# Altium footprint library 总库.PcbLib: 264 footprints (part 16 of 17)
Each footprint in its own frame and in the unit in brackets; x right, y up, seen from the top. Pads: shape width x height; smd on the part's side, far side on the other; paste and mask are expansions set on the pad; w line width, h text height; cw(c..) or ccw(c..) is an arc to the next point about the centre after c.
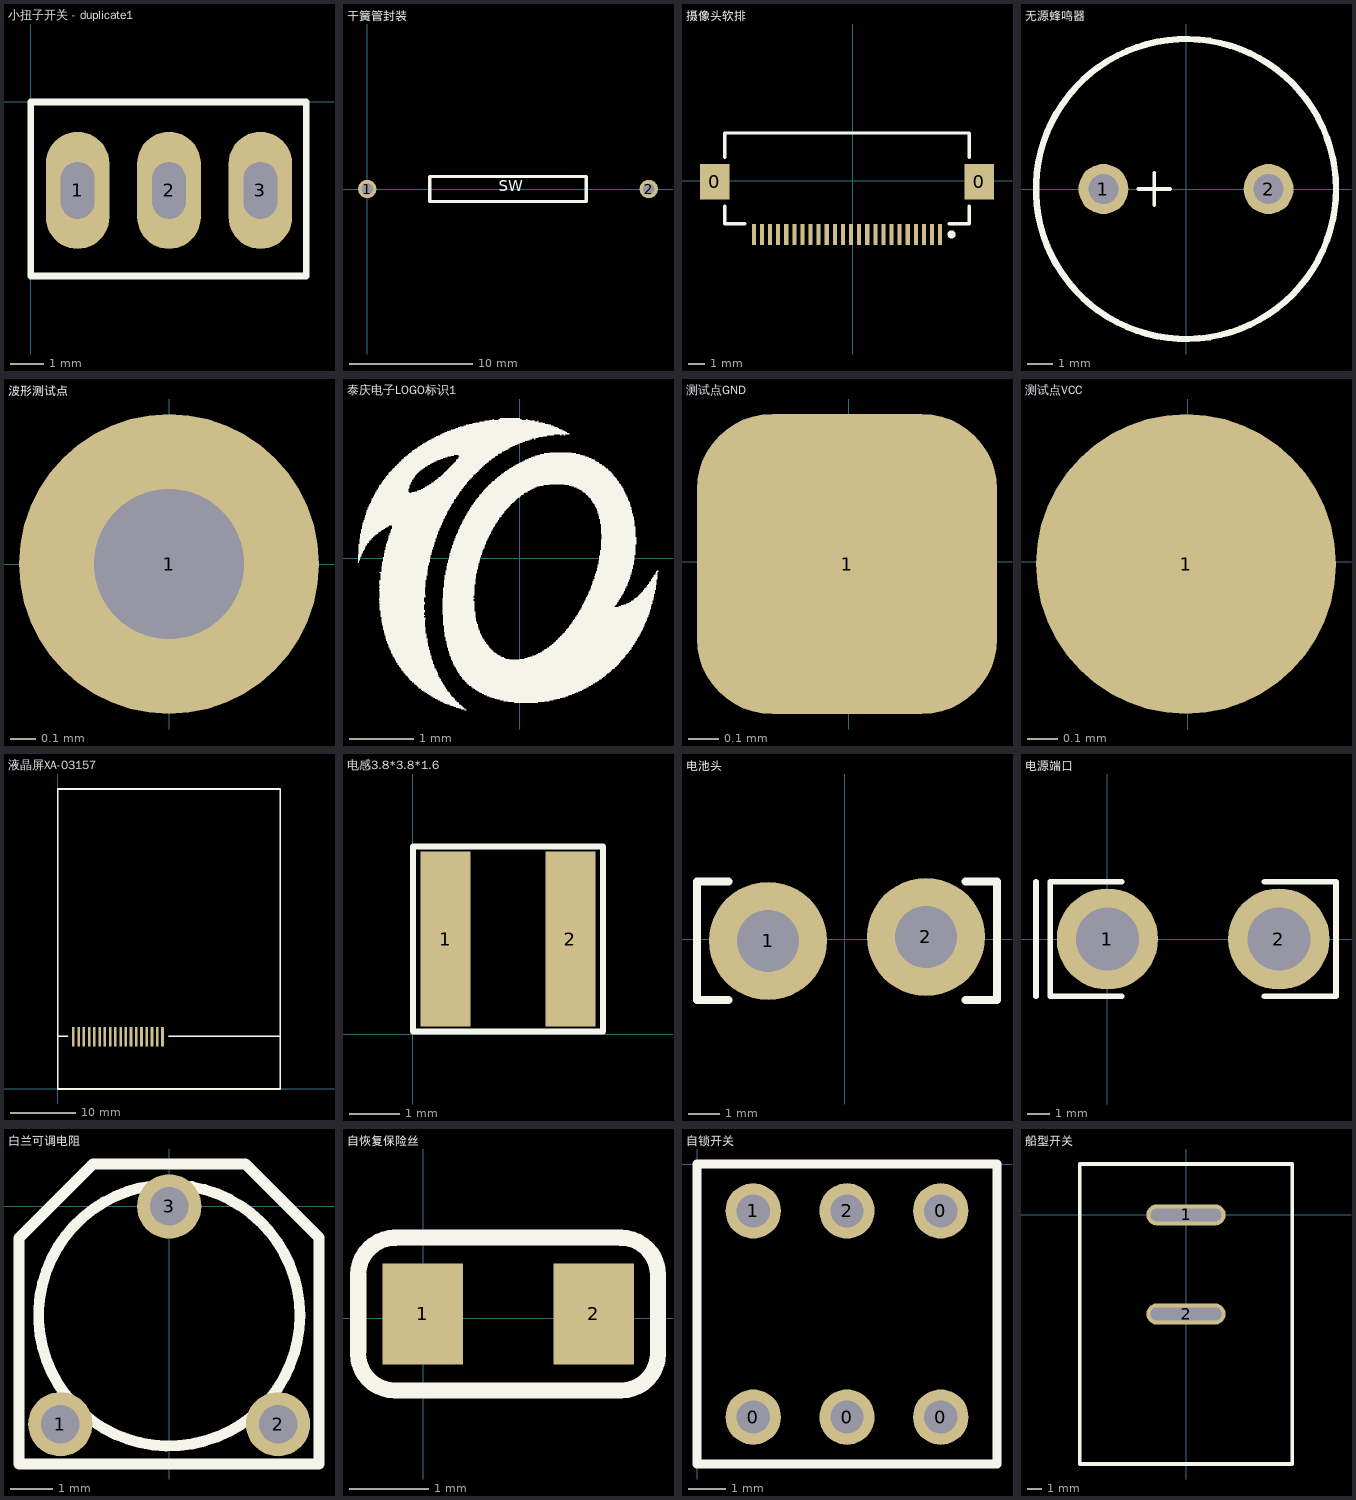
[diagram p15: the footprints below, top view; thin cyan lines are the x and y axes]

## 小扭子开关 - duplicate1 [mm]
pads (3):
  oval 1.9x3.5 hole 1 slot 1.7 at 90 deg: 1(1.397,-2.642) 2(4.127,-2.642) 3(6.858,-2.642)
Top Overlay:
  lines w0.203: 8.2,-5.2 0,-5.2 0,0 8.2,0 ; 8.23,-5.2 8.23,0

## 干簧管封装 [mm]
pads (2):
  round 1.5 hole 0.9: 1(0,0) 2(22.86,0)
Top Overlay:
  lines w0.254: 5.08,-1.016 17.78,-1.016 17.78,1.016 5.08,1.016 5.08,-1.016
  text "SW" at 10.668,-0.508 h1.52

## 摄像头软排 [mm]
pads (26):
  rect 1.8x2.2 smd: 0(-8.514,-0.051) 0(7.802,-0.051)
  rect 0.25x1.3 smd: 1(5.394,-3.301) 2(4.894,-3.301) 3(4.394,-3.301) 4(3.894,-3.301) 5(3.394,-3.301) 6(2.894,-3.301) 7(2.394,-3.301) 8(1.894,-3.301) 9(1.394,-3.301) 10(0.894,-3.301) 11(0.394,-3.301) 12(-0.106,-3.301) 13(-0.606,-3.301) 14(-1.106,-3.301) 15(-1.606,-3.301) 16(-2.106,-3.301) 17(-2.606,-3.301) 18(-3.106,-3.301) 19(-3.606,-3.301) 20(-4.106,-3.301) 21(-4.606,-3.301) 22(-5.106,-3.301) 23(-5.606,-3.301) 24(-6.106,-3.301)
Top Overlay:
  circle w0.25: c6.094,-3.301 r0.125
  lines w0.2: -7.906,-1.551 -7.906,-2.651 -6.656,-2.651 ; -7.906,1.449 -7.906,2.949 7.194,2.949 7.194,1.449 ; 5.944,-2.651 7.194,-2.651 7.194,-1.551
3D body: height 2.08, standoff -0.03, extent -9.106,-3.083 8.394,2.253

## 无源蜂鸣器 [mm]
pads (2):
  round 2 hole 1.2: 1(-3.302,0) 2(3.302,0)
Top Overlay:
  circle w0.254: c0,0 r6
  lines w0.152: -1.905,0 -0.635,0 ; -1.27,-0.635 -1.27,0.635

## 波形测试点 [mm]
pads (1):
  round 1.2 hole 0.6: 1(0,0)

## 泰庆电子LOGO标识1 [mm]
Top Overlay:
  drawing of 1030 lines, arcs and shapes, not listed

## 测试点GND [mm]
pads (1):
  rrect50% 1x1 smd: 1(-0.006,-0.008)

## 测试点VCC [mm]
pads (1):
  round 1 smd: 1(-0.006,-0.008)

## 液晶屏XA-03157 [mm]
pads (18):
  rect 0.4x3 smd: 1(2.4,8.001) 2(3.2,8.001) 3(4,8.001) 4(4.8,8.001) 5(5.6,8.001) 6(6.4,8.001) 7(7.2,8.001) 8(8,8.001) 9(8.8,8.001) 10(9.6,8.001) 11(10.4,8.001) 12(11.2,8.001) 13(12,8.001) 14(12.8,8.001) 15(13.6,8.001) 16(14.4,8.001) 17(15.2,8.001) 18(16,8.001)
Top Overlay:
  lines w0.254: 0,8.05 1.5,8.05 ; 17,8.05 34,8.05 ; 0,0 0,45.83 34,45.83 34,0 0,0

## 电感3.8*3.8*1.6 [mm]
pads (2):
  rect 1x3.5 smd: 1(0.65,1.9) 2(3.15,1.9)
Top Overlay:
  lines w0.127: 0,0.05 3.8,0.05 3.8,3.75 0,3.75 0,0.05
3D body: height 1.15, standoff 0, extent 0.25,0.15 3.55,3.65

## 电池头 [mm]
pads (2):
  round 3.8 hole 2: 1(-2.464,-0.051) 2(2.616,0.076)
Top Overlay:
  lines w0.254: -3.734,-1.956 -4.75,-1.956 -4.75,1.854 -3.734,1.854 ; 3.886,-1.956 4.902,-1.956 4.902,1.854 3.886,1.854

## 电源端口 [mm]
pads (2):
  round 4.5 hole 2.8: 1(0,0) 2(7.62,0)
Top Overlay:
  lines w0.254: -3.175,-2.54 -3.175,2.54 ; 0.635,-2.54 -2.54,-2.54 -2.54,2.54 0.635,2.54 ; 6.985,-2.54 10.16,-2.54 10.16,2.54 6.985,2.54

## 白兰可调电阻 [mm]
pads (3):
  round 1.5 hole 0.9: 1(-2.54,-5.08) 2(2.54,-5.08) 3(0,0)
Top Overlay:
  circle w0.254: c0,-2.54 r3.048
  lines w0.254: -3.505,-0.737 -1.778,0.991 ; -3.505,-0.737 -3.505,-6.009 3.495,-6.009 3.495,-0.726 ; -3.505,-0.737 -1.778,0.991 ; -1.778,0.991 1.778,0.991 ; 1.778,0.991 3.495,-0.726 ; 1.778,0.991 3.495,-0.726
3D body: height 5.84, standoff 0, extent -3.057,-5.597 3.057,0.517
3D body: height 5.59, standoff 0, extent -3.506,-6.01 3.495,0.991

## 自恢复保险丝 [mil]
pads (2):
  rect 40x50 smd: 1(-0.4,2) 2(84.6,2)
Top Overlay:
  lines w8: -32.5,-17.59 ccw(c-14.09,-17.59) -14.09,-36 ; -32.4,-16.5 -32.4,20.5 ; -32.4,21.5 cw(c-13.99,21.5) -13.99,39.91 ; -14.51,40 97.69,40 ; -13.09,-36 97.72,-36 ; 98.2,-36 ccw(c98.2,-17.59) 116.61,-17.59 ; 98.2,39.91 cw(c98.2,21.5) 116.61,21.5 ; 116.6,-16.59 116.6,20.5
3D body: height 30.39, standoff -0.39, extent 2.86,-22.61 81.6,26.61

## 自锁开关 [mm]
pads (6):
  round 1.5 hole 0.9: 0(1.524,-6.858) 0(4.064,-6.858) 0(6.604,-6.858) 0(6.604,-1.27) 1(1.524,-1.27) 2(4.064,-1.27)
Top Overlay:
  lines w0.254: 0,-8.128 8.128,-8.128 8.128,0 0,0 0,-8.128
3D body: height 13.63, standoff -3.37, extent 0.091,-8.001 8.291,-0.001

## 船型开关 [mm]
pads (2):
  oval 5.6x1.5 hole 0.9 slot 5 at 0 deg: 1(0,0) 2(0,-7)
Top Overlay:
  lines w0.254: -7.5,-17.6 7.5,-17.6 7.5,3.6 -7.5,3.6 -7.5,-17.6